# Altium footprint library Footprints.PcbLib: 76 footprints (part 1 of 5)
Each footprint in its own frame and in the unit in brackets; x right, y up, seen from the top. Pads: shape width x height; smd on the part's side, far side on the other; paste and mask are expansions set on the pad; w line width, h text height; cw(c..) or ccw(c..) is an arc to the next point about the centre after c.
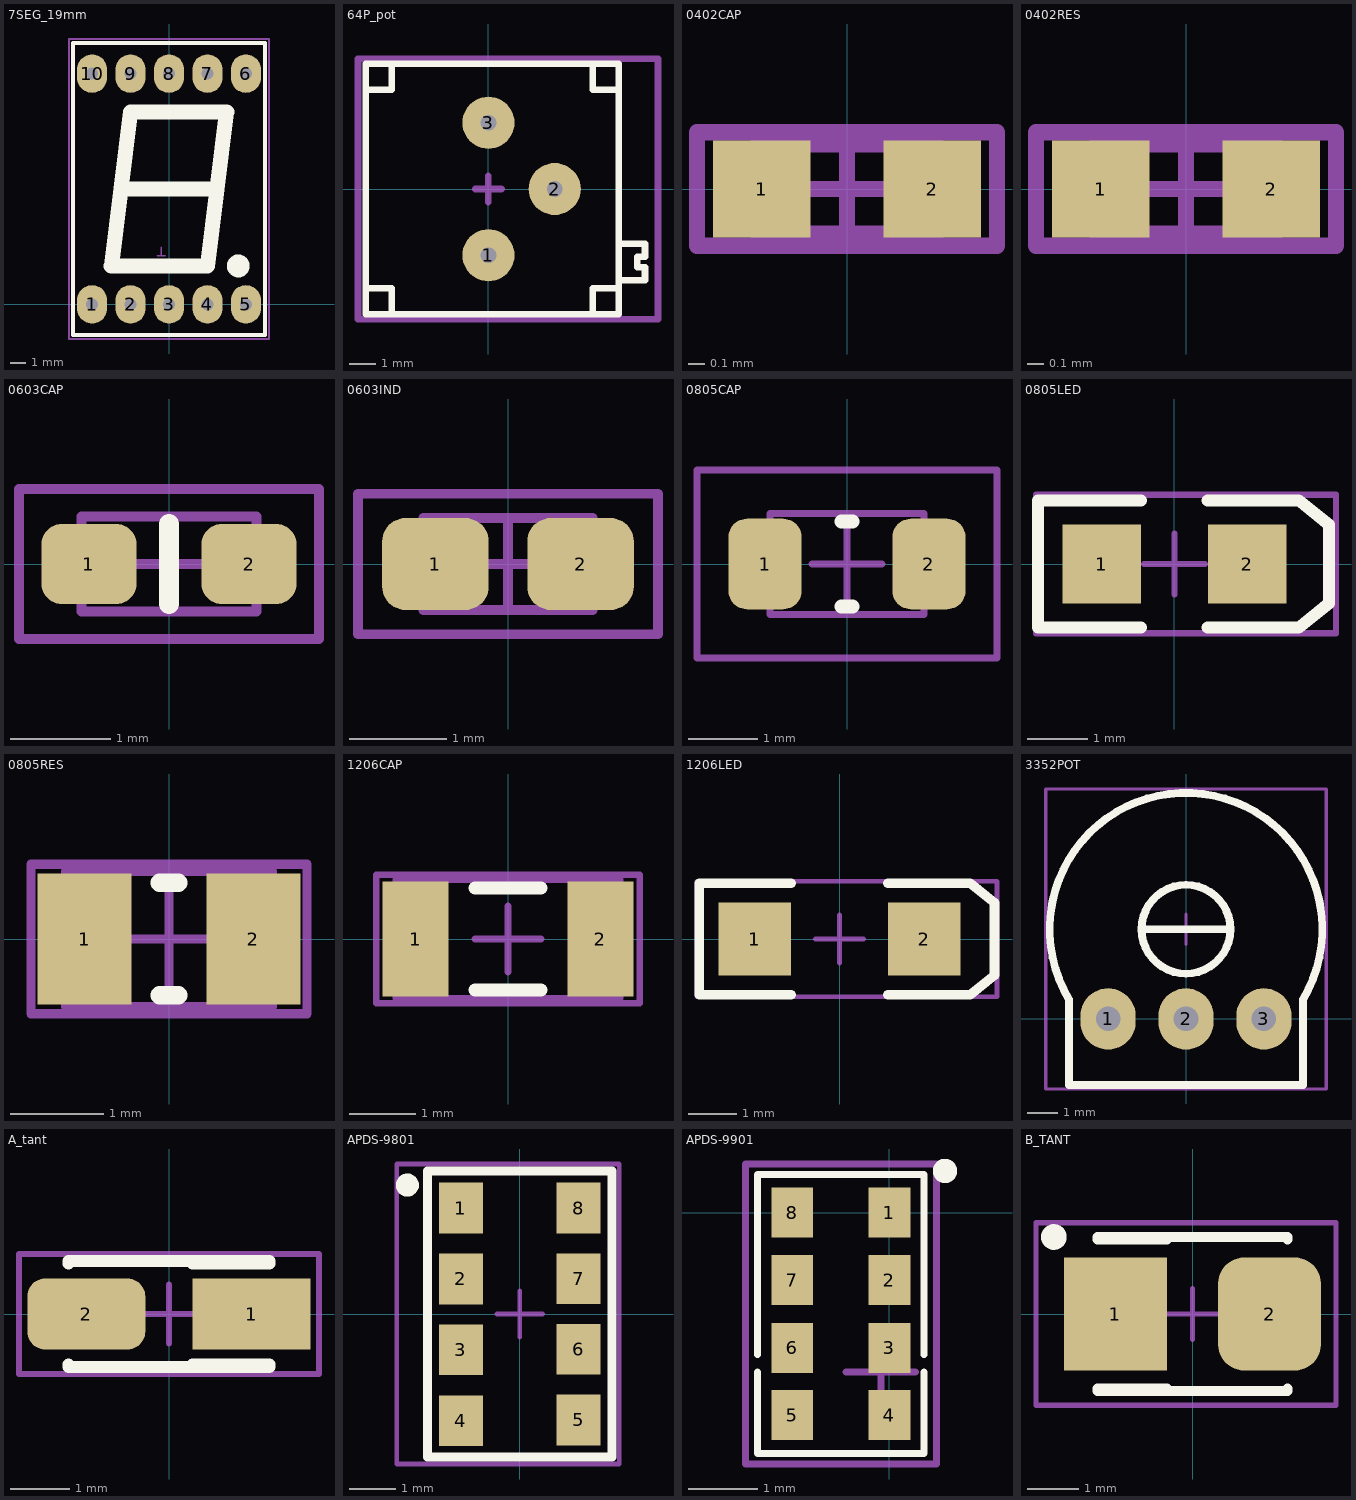
[diagram p0: the footprints below, top view; thin cyan lines are the x and y axes]

## 7SEG_19mm [mm] "7 segment display 12,6õ19mm"
height 8
pads (10):
  oval 2x2.54 hole 0.8 paste+0 mask+0: 1(-5.08,0) 2(-2.54,0) 3(0,0) 4(2.54,0) 5(5.08,0) 6(5.08,15.24) 7(2.54,15.24) 8(0,15.24) 9(-2.54,15.24) 10(-5.08,15.24)
Top Overlay:
  circle w1: c4.572,2.54 r0.254
  lines w0.254: -6.35,-2.032 6.35,-2.032 6.35,17.272 -6.35,17.272 -6.35,-2.032
  lines w1: -3.048,7.62 3.175,7.62 ; -3.81,2.54 2.54,2.54 3.81,12.7 -2.54,12.7 -3.81,2.54
Mechanical 15:
  lines w0.1: -0.783,3.225 -0.233,3.225 ; -0.508,3.225 -0.508,3.775 ; -6.604,-2.286 -6.604,17.526 6.604,17.526 6.604,-2.286 -6.604,-2.286
3D body "7 Segment LED Module.step": height 8, standoff -3.5, extent -6.15,-1.88 6.15,17.12

## 64P_pot [mm] "M64Y102KB40 series pot"
height 5.2
pads (3):
  round 2 hole 0.6 unplated: 1(0,-2.54) 2(2.54,0) 3(0,2.54)
Top Overlay:
  lines w0.254: -4.7,-3.8 -3.7,-3.8 -3.7,-4.8 ; -4.7,3.8 -3.7,3.8 -3.7,4.8 ; 4,-4.8 4,-3.8 5,-3.8 ; 4,4.8 4,3.8 5,3.8 ; 5,-3.5 6,-3.5 6,-3 5.7,-3 5.7,-2.8 5.7,-2.6 6,-2.6 6,-2.1 5,-2.1 ; -4.7,-4.8 5,-4.8 5,0 5,4.8 -4.7,4.8 -4.7,-4.8
Mechanical 15:
  lines w0.254: -0.5,0 0.5,0 ; 0,-0.5 0,0.5 ; -5,-5 -5,5 6.5,5 6.5,-5 -5,-5
3D body "3296p_10k.stp": height 5.2, standoff -3.74, extent -5.232,-4.775 6.299,4.775

## 0402CAP [mm] "Chip Capacitor, 2-Leads, Body 1,1x0,5mm, IPC High Density"
height 0.6
pads (2):
  rect 0.6x0.6 smd: 1(-0.525,0) 2(0.525,0)
Mechanical 13:
  lines w0.1: -0.55,-0.275 0.55,-0.275 0.55,0.275 -0.55,0.275 -0.55,-0.275
Mechanical 15:
  lines w0.1: -0.275,0 0.275,0 ; 0,-0.275 0,0.275 ; -0.925,-0.35 0.925,-0.35 0.925,0.35 -0.925,0.35 -0.925,-0.35
3D body "0402 SMD Capacitor.step": height 0.2, standoff 0, extent -0.5,-0.3 0.5,0.3

## 0402RES [mm] "Chip Resistor 2-Leads, Body 1,1x0,5mm, IPC High Density"
height 0.6
pads (2):
  rect 0.6x0.6 smd: 1(-0.525,0) 2(0.525,0)
Mechanical 13:
  lines w0.1: -0.55,-0.275 -0.55,0.275 0.55,0.275 0.55,-0.275 -0.55,-0.275
Mechanical 15:
  lines w0.1: -0.275,0 0.275,0 ; 0,-0.275 0,0.275 ; -0.925,-0.35 -0.925,0.35 0.925,0.35 0.925,-0.35 -0.925,-0.35
3D body "0402 RES.step": height 0.35, standoff 0, extent -0.5,-0.25 0.5,0.25

## 0603CAP [mm] "Chip Capacitor, 2-Leads, Body 1,7x0,9mm, IPC High Density"
height 0.9
pads (2):
  rrect50% 0.95x0.8 smd: 1(-0.8,0) 2(0.8,0)
Top Overlay:
  lines w0.2: 0,-0.4 0,0.4
Mechanical 13:
  lines w0.1: -0.875,-0.475 0.875,-0.475 0.875,0.475 -0.875,0.475 -0.875,-0.475
Mechanical 15:
  lines w0.1: -0.475,0 0.475,0 ; 0,-0.475 0,0.475 ; -1.5,-0.75 1.5,-0.75 1.5,0.75 -1.5,0.75 -1.5,-0.75
3D body "0603 SMD Capacitor.step": height 0.3, standoff 0, extent -0.8,-0.4 0.8,0.4

## 0603IND [mm] "Chip Inductor, 2-Leads, Body 1.6x0.8mm, IPC Medium Density"
height 0.8
pads (2):
  rrect50% 1.1x0.95 smd: 1(-0.75,0) 2(0.75,0)
Mechanical 13:
  lines w0.1: -0.875,-0.475 -0.875,0.475 0.875,0.475 0.875,-0.475 -0.875,-0.475
Mechanical 15:
  lines w0.1: -0.475,0 0.475,0 ; 0,-0.475 0,0.475 ; -1.55,-0.725 -1.55,0.725 1.55,0.725 1.55,-0.725 -1.55,-0.725
3D body "0603Ind.step": height 0.8, standoff 0, extent -0.8,-0.475 0.8,0.475

## 0805CAP [mm] "Chip Capacitor, 2-Leads, Body 2,1x1,4mm, IPC High Density"
height 1.3
pads (2):
  rrect50% 1.05x1.3 smd: 1(-1.175,0) 2(1.175,0)
Top Overlay:
  lines w0.2: -0.076,-0.61 0.076,-0.61 ; -0.076,0.61 0.076,0.61
Mechanical 13:
  lines w0.1: -1.105,-0.725 1.105,-0.725 1.105,0.725 -1.105,0.725 -1.105,-0.725
Mechanical 15:
  lines w0.1: -0.5,0 0.5,0 ; 0,-0.5 0,0.5 ; -2.15,-1.35 -2.15,1.35 2.15,1.35 2.15,-1.35 -2.15,-1.35
3D body "0805 SMD Capacitor.step": height 0.78, standoff 0, extent -1,-0.625 1,0.625

## 0805LED [mm] "SM LED; 2 Flat Leads"
height 0.9
pads (2):
  rect 1.3x1.3 smd: 1(-1.2,0) 2(1.2,0)
Top Overlay:
  lines w0.2: -0.55,-1.05 -2.25,-1.05 -2.25,1.05 -0.55,1.05 ; 0.55,-1.05 2.05,-1.05 2.55,-0.65 2.55,0.65 2.05,1.05 0.55,1.05
Mechanical 15:
  lines w0.1: -0.5,0 0.5,0 ; 0,-0.5 0,0.5 ; -2.286,-1.143 2.667,-1.143 2.667,1.143 -2.286,1.143 -2.286,-1.143
3D body "LED SMD0805.step": height 0.85, standoff 0.01, extent -1.031,-0.483 1.031,0.424

## 0805RES [mm] "Chip Resistor 2-Leads, Body 2,1x1,4mm, IPC High Density"
height 1.3
pads (2):
  rect 1x1.4 smd: 1(-0.902,0) 2(0.902,0)
Top Overlay:
  lines w0.2: -0.1,-0.6 0.1,-0.6 ; -0.1,0.6 0.1,0.6
Mechanical 13:
  lines w0.1: -1.105,-0.725 -1.105,0.725 1.105,0.725 1.105,-0.725 -1.105,-0.725
Mechanical 15:
  lines w0.1: -0.5,0 0.5,0 ; 0,-0.5 0,0.5 ; -1.473,-0.8 -1.473,0.8 1.473,0.8 1.473,-0.8 -1.473,-0.8
3D body "0805 RES.step": height 0.45, standoff 0, extent -1,-0.625 1,0.625

## 1206CAP [mm] "Chip Capacitor, 2-Leads, Body 3,3x1,7mm, IPC High Density"
height 1.5
pads (2):
  rect 1x1.75 smd: 1(-1.4,0) 2(1.4,0)
Top Overlay:
  lines w0.2: -0.5,-0.775 0.5,-0.775 ; -0.5,0.775 0.5,0.775
Mechanical 13:
  lines w0.1: -1.7,-0.9 -1.7,0.9 1.7,0.9 1.7,-0.9 -1.7,-0.9
Mechanical 15:
  lines w0.1: -0.5,0 0.5,0 ; 0,-0.5 0,0.5 ; -2,-0.975 -2,0.975 2,0.975 2,-0.975 -2,-0.975
3D body "1206 SMD Capacitor.step": height 1, standoff 0, extent -1.6,-0.8 1.6,0.8

## 1206LED [mm] "SM LED; 2 Flat Leads"
height 1.2
pads (2):
  rect 1.5x1.5 smd: 1(-1.75,0) 2(1.75,0)
Top Overlay:
  lines w0.2: -1,-1.15 -2.9,-1.15 -2.9,1.15 -1,1.15 ; 1,-1.15 2.7,-1.15 3.2,-0.75 3.2,0.75 2.7,1.15 1,1.15
Mechanical 1:
  lines w0.1: -0.2,0 0.2,0 ; 0,-0.2 0,0.2
Mechanical 15:
  lines w0.1: -0.5,0 0.5,0 ; 0,-0.5 0,0.5 ; -2.946,-1.194 3.251,-1.194 3.251,1.194 -2.946,1.194 -2.946,-1.194
3D body "LED 1206.step": height 1.1, standoff 0, extent -1.6,-0.8 1.6,0.8

## 3352POT [mm] "3352-T potentiometer"
height 4
pads (3):
  oval 1.8x2 hole 0.8 paste+0 mask+0: 1(-2.54,0) 2(0,0) 3(2.54,0)
Top Overlay:
  circle w0.254: c0,2.921 r1.448
  lines w0.254: -1.397,2.921 1.448,2.921 ; -3.812,-2.159 -3.812,0.634 cw(c0,2.921) 3.812,0.634 3.812,-2.159 1.905,-2.159 -3.812,-2.159
Mechanical 15:
  lines w0.1: -0.5,2.921 0.5,2.921 ; 0,2.421 0,3.421 ; -4.572,-2.286 4.572,-2.286 4.572,7.493 -4.572,7.493 -4.572,-2.286
3D body "3352T.step": height 3.81, standoff -4.75, extent -4.444,-2.159 4.445,7.366

## A_tant [mm] "Capacitor, SM Tantalum; Body 3.2 x 1.6 mm (LxW typ)"
height 1.8
pads (2):
  rect 2x1.2 smd: 1(1.4,0)
  rrect50% 2x1.2 smd: 2(-1.4,0)
Top Overlay:
  lines w0.2: -1.7,-0.85 -1.7,-0.9 1.7,-0.9 ; -1.7,0.85 -1.7,0.9 1.7,0.9 ; 0.4,-0.85 1.7,-0.85 ; 0.4,0.85 1.7,0.85
Mechanical 15:
  lines w0.1: -0.5,0 0.5,0 ; 0,-0.5 0,0.5 ; -2.54,-1.016 -2.54,1.016 2.54,1.016 2.54,-1.016 -2.54,-1.016
3D body "User Library-CaseA_3216-18.step": height 1.6, standoff 0, extent -1.6,-0.8 1.6,0.8

## APDS-9801 [mm] "APDS-9801 Package Outline"
height 1.75
pads (8):
  rect 0.95x1.1 smd: 1(-1.275,2.295) 2(-1.275,0.76) 3(-1.275,-0.776) 4(-1.275,-2.311) 5(1.275,-2.295) 6(1.275,-0.765) 7(1.275,0.765) 8(1.275,2.295)
Top Overlay:
  circle w0.25: c-2.436,2.794 r0.125
  lines w0.2: -2,-3.1 2,-3.1 2,3.1 -2,3.1 -2,-3.1
Mechanical 15:
  lines w0.1: -0.5,0 0.5,0 ; 0,-0.5 0,0.5 ; -2.667,-3.251 2.159,-3.251 2.159,3.251 -2.667,3.251 -2.667,-3.251
3D body: height 1.76, standoff 0.1, extent -1.981,-3.073 1.981,3.073

## APDS-9901 [mm]
pads (8):
  rect 0.6x0.72 smd: 1(0,0) 2(0,-0.975) 3(0,-1.95) 4(0,-2.92) 5(-1.4,-2.92) 6(-1.4,-1.95) 7(-1.4,-0.975) 8(-1.4,0)
Top Overlay:
  circle w0.25: c0.8,0.6 r0.05
  lines w0.1: -1.9,-2.3 -1.9,-3.475 0.5,-3.475 0.5,-2.3 ; -1.9,-2.05 -1.9,-0.959 -1.9,-0.456 -1.9,0.55 0.5,0.55 0.5,-0.456 0.5,-0.959 0.5,-2.05
Mechanical 15:
  lines w0.1: -0.625,-2.3 0.375,-2.3 ; -0.125,-2.8 -0.125,-1.8 ; -2.075,-3.625 0.675,-3.625 0.675,0.7 -2.075,0.7 -2.075,-3.625
3D body: height 1.76, standoff 0.1, extent -1.9,-3.475 0.5,0.55

## B_TANT [mm] "Capacitor, SM Tantalum; Body 3.5 x 2.8 mm (LxW typ)"
height 2.1
pads (2):
  rect 2x2.2 smd: 1(-1.5,0)
  rrect50% 2x2.2 smd: 2(1.5,0)
Top Overlay:
  circle w0.25: c-2.7,1.5 r0.125
  lines w0.2: -1.85,-1.5 1.85,-1.5 1.85,-1.45 ; -1.85,-1.45 -0.5,-1.45 ; -1.85,1.45 -0.5,1.45 ; -1.85,1.5 1.85,1.5 1.85,1.45
Mechanical 15:
  lines w0.1: -0.5,0 0.5,0 ; 0,-0.5 0,0.5 ; -3.048,-1.778 2.794,-1.778 2.794,1.778 -3.048,1.778 -3.048,-1.778
3D body "Tantalum Capacitor Case B.STEP": height 2.09, standoff -0.01, extent -1.844,-1.393 1.847,1.427